# Altium footprint library Connectors.PcbLib: 245 footprints (part 13 of 16)
Each footprint in its own frame and in the unit in brackets; x right, y up, seen from the top. Pads: shape width x height; smd on the part's side, far side on the other; paste and mask are expansions set on the pad; w line width, h text height; cw(c..) or ccw(c..) is an arc to the next point about the centre after c.
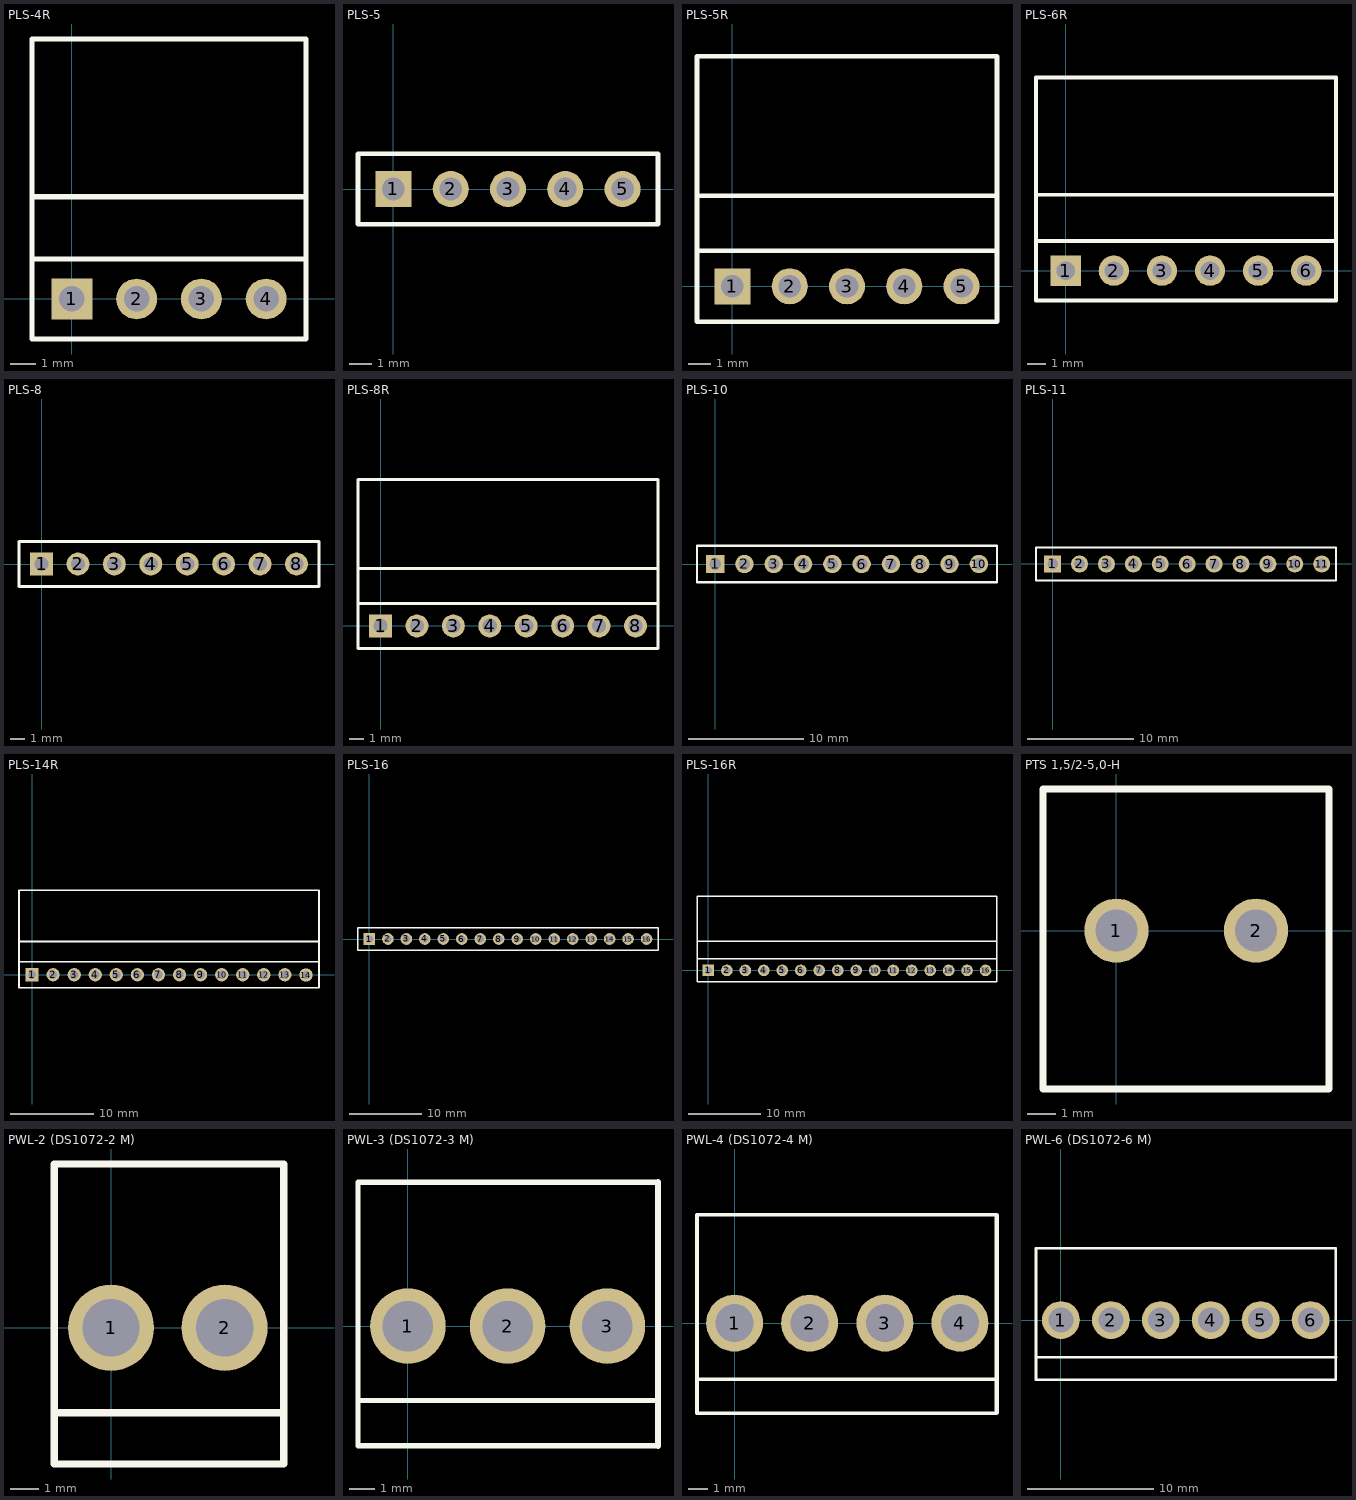
[diagram p12: the footprints below, top view; thin cyan lines are the x and y axes]

## PLS-4R [mm]
pads (4):
  rect 1.6x1.6 hole 1: 1(0,0)
  round 1.6 hole 1: 2(2.54,0) 3(5.08,0) 4(7.62,0)
Top Overlay:
  lines w0.2: -1.57,1.57 9.19,1.57 ; -1.57,4.01 9.19,4.01 ; -1.57,-1.57 -1.57,10.2 9.19,10.2 9.19,-1.57 -1.57,-1.57
3D body "PLS-R.STEP": height 2.44, standoff -3.05, extent -1.27,-0.32 3.81,9.9
3D body "PLS-R.STEP": height 2.44, standoff -3.05, extent 3.81,-0.32 8.89,9.9

## PLS-5 [mm]
pads (5):
  rect 1.6x1.6 hole 1: 1(0,0)
  round 1.6 hole 1: 2(2.54,0) 3(5.08,0) 4(7.62,0) 5(10.16,0)
Top Overlay:
  lines w0.2: -1.57,-1.57 11.73,-1.57 11.73,1.57 -1.57,1.57 -1.57,-1.57
3D body "PLS-5.stp": height 8.7, standoff -3, extent -1.27,-1.27 11.43,1.27

## PLS-5R [mm]
pads (5):
  rect 1.6x1.6 hole 1: 1(0,0)
  round 1.6 hole 1: 2(2.54,0) 3(5.08,0) 4(7.62,0) 5(10.16,0)
Top Overlay:
  lines w0.2: -1.57,1.57 11.73,1.57 ; -1.57,4.01 11.73,4.01 ; -1.57,-1.57 -1.57,10.2 11.73,10.2 11.73,-1.57 -1.57,-1.57
3D body "PLS-5R.STEP": height 2.44, standoff -3.05, extent -1.27,-0.32 11.43,9.9

## PLS-6R [mm]
pads (6):
  rect 1.6x1.6 hole 1: 1(0,0)
  round 1.6 hole 1: 2(2.54,0) 3(5.08,0) 4(7.62,0) 5(10.16,0) 6(12.7,0)
Top Overlay:
  lines w0.2: -1.57,1.57 14.27,1.57 ; -1.57,4.01 14.27,4.01 ; -1.57,-1.57 14.27,-1.57 14.27,10.2 -1.57,10.2 -1.57,-1.57
3D body "PLS-R.STEP": height 2.44, standoff -3.05, extent 3.81,-0.32 8.89,9.9
3D body "PLS-R.STEP": height 2.44, standoff -3.05, extent -1.27,-0.32 3.81,9.9
3D body "PLS-R.STEP": height 2.44, standoff -3.05, extent 8.89,-0.32 13.97,9.9

## PLS-8 [mm]
pads (8):
  rect 1.6x1.6 hole 1: 1(0,0)
  round 1.6 hole 1: 2(2.54,0) 3(5.08,0) 4(7.62,0) 5(10.16,0) 6(12.7,0) 7(15.24,0) 8(17.78,0)
Top Overlay:
  lines w0.2: -1.57,-1.57 -1.57,1.57 19.35,1.57 19.35,-1.57 -1.57,-1.57
3D body "PLS-8.stp": height 8.7, standoff -3, extent -1.27,-1.27 19.05,1.27

## PLS-8R [mm]
pads (8):
  rect 1.6x1.6 hole 1: 1(0,0)
  round 1.6 hole 1: 2(2.54,0) 3(5.08,0) 4(7.62,0) 5(10.16,0) 6(12.7,0) 7(15.24,0) 8(17.78,0)
Top Overlay:
  lines w0.2: -1.57,1.57 19.35,1.57 ; -1.57,4.01 19.35,4.01 ; -1.57,-1.57 19.35,-1.57 19.35,10.2 -1.57,10.2 -1.57,-1.57
3D body "PLS-R.STEP": height 2.44, standoff -3.05, extent 3.81,-0.32 8.89,9.9
3D body "PLS-R.STEP": height 2.44, standoff -3.05, extent -1.27,-0.32 3.81,9.9
3D body "PLS-R.STEP": height 2.44, standoff -3.05, extent 13.97,-0.32 19.05,9.9
3D body "PLS-R.STEP": height 2.44, standoff -3.05, extent 8.89,-0.32 13.97,9.9

## PLS-10 [mm]
pads (10):
  rect 1.6x1.6 hole 1: 1(0,0)
  round 1.6 hole 1: 2(2.54,0) 3(5.08,0) 4(7.62,0) 5(10.16,0) 6(12.7,0) 7(15.24,0) 8(17.78,0) 9(20.32,0) 10(22.86,0)
Top Overlay:
  lines w0.2: -1.57,-1.57 24.43,-1.57 24.43,1.57 -1.57,1.57 -1.57,-1.57
3D body "PLS-10.stp": height 8.7, standoff -3, extent -1.27,-1.27 24.13,1.27

## PLS-11 [mm]
pads (11):
  rect 1.6x1.6 hole 1: 1(0,0)
  round 1.6 hole 1: 2(2.54,0) 3(5.08,0) 4(7.62,0) 5(10.16,0) 6(12.7,0) 7(15.24,0) 8(17.78,0) 9(20.32,0) 10(22.86,0) 11(25.4,0)
Top Overlay:
  lines w0.2: -1.57,-1.57 26.75,-1.57 26.75,1.57 -1.57,1.57 -1.57,-1.57
3D body "PLS-10.stp": height 8.7, standoff -3, extent 1.25,-1.29 26.65,1.25
3D body "PLS-10.stp": height 8.7, standoff -3, extent -1.27,-1.27 24.13,1.27

## PLS-14R [mm]
pads (14):
  rect 1.6x1.6 hole 1: 1(0,0)
  round 1.6 hole 1: 2(2.54,0) 3(5.08,0) 4(7.62,0) 5(10.16,0) 6(12.7,0) 7(15.24,0) 8(17.78,0) 9(20.32,0) 10(22.86,0) 11(25.4,0) 12(27.94,0) 13(30.48,0) 14(33.02,-0.025)
Top Overlay:
  lines w0.2: -1.57,1.57 34.59,1.57 ; -1.57,4.01 34.59,4.01 ; -1.57,-1.57 34.59,-1.57 34.59,10.2 -1.57,10.2 -1.57,-1.57
3D body "PLS-R.STEP": height 2.44, standoff -3.05, extent 29.21,-0.32 34.29,9.9
3D body "PLS-R.STEP": height 2.44, standoff -3.05, extent -1.27,-0.32 3.81,9.9
3D body "PLS-5R.STEP": height 2.44, standoff -3.05, extent 3.81,-0.32 16.51,9.9
3D body "PLS-5R.STEP": height 2.44, standoff -3.05, extent 16.51,-0.32 29.21,9.9

## PLS-16 [mm]
pads (16):
  rect 1.6x1.6 hole 1: 1(0,0)
  round 1.6 hole 1: 2(2.54,0) 3(5.08,0) 4(7.62,0) 5(10.16,0) 6(12.7,0) 7(15.24,0) 8(17.78,0) 9(20.32,0) 10(22.86,0) 11(25.4,0) 12(27.94,0) 13(30.48,0) 14(33.02,0) 15(35.56,0) 16(38.1,0)
Top Overlay:
  lines w0.2: -1.57,-1.57 39.67,-1.57 39.67,1.57 -1.57,1.57 -1.57,-1.57
3D body "PLS-16.stp": height 8.7, standoff -3, extent -1.27,-1.27 39.37,1.27

## PLS-16R [mm]
pads (16):
  rect 1.6x1.6 hole 1: 1(0,0)
  round 1.6 hole 1: 2(2.54,0) 3(5.08,0) 4(7.62,0) 5(10.16,0) 6(12.7,0) 7(15.24,0) 8(17.78,0) 9(20.32,0) 10(22.86,0) 11(25.4,0) 12(27.94,0) 13(30.48,0) 14(33.02,0) 15(35.56,0) 16(38.1,0)
Top Overlay:
  lines w0.2: -1.57,1.57 39.67,1.57 ; -1.57,4.01 39.67,4.01 ; -1.57,-1.57 39.67,-1.57 39.67,10.2 -1.57,10.2 -1.57,-1.57
3D body "PLS-R.STEP": height 2.44, standoff -3.05, extent 8.89,-0.32 13.97,9.9
3D body "PLS-R.STEP": height 2.44, standoff -3.05, extent 24.13,-0.32 29.21,9.9
3D body "PLS-R.STEP": height 2.44, standoff -3.05, extent 19.05,-0.32 24.13,9.9
3D body "PLS-R.STEP": height 2.44, standoff -3.05, extent 13.97,-0.32 19.05,9.9
3D body "PLS-R.STEP": height 2.44, standoff -3.05, extent 29.21,-0.32 34.29,9.9
3D body "PLS-R.STEP": height 2.44, standoff -3.05, extent 34.29,-0.32 39.37,9.9
3D body "PLS-R.STEP": height 2.44, standoff -3.05, extent 3.81,-0.32 8.89,9.9
3D body "PLS-R.STEP": height 2.44, standoff -3.05, extent -1.27,-0.32 3.81,9.9

## PTS 1,5/2-5,0-H [mm]
height 13.6
pads (2):
  round 2.3 hole 1.5: 1(0,0) 2(5,0)
Top Overlay:
  lines w0.254: -2.63,-5.67 -2.63,5.07 7.611,5.07 7.611,0 7.611,-5.67 -2.63,-5.67
3D body "1792863.stp": height 13.72, standoff -2.38, extent -2.49,-5.56 7.51,4.94

## PWL-2 (DS1072-2 M) [mm] "PHU-8 (DS1072-8 F) ответная часть"
pads (2):
  round 3 hole 2: 1(0,0) 2(3.96,0)
Top Overlay:
  lines w0.254: -1.96,-2.96 6.02,-2.96 ; -1.98,-4.75 -1.98,5.71 6.02,5.71 6.02,-4.75 -1.98,-4.75
3D body "User Library-PWL-2.step": height 13.8, standoff -3.6, extent -2.02,-4.76 5.9,5.64

## PWL-3 (DS1072-3 M) [mm] "PHU-8 (DS1072-8 F) ответная часть"
pads (3):
  round 3 hole 2: 1(0,0) 2(3.96,0) 3(7.92,0)
Top Overlay:
  lines w0.2: -1.96,-2.96 9.93,-2.96 ; 9.93,-4.75 -1.98,-4.75 -1.98,5.71 9.93,5.71
  lines w0.254: 9.93,-4.75 9.93,2.813 9.93,5.71
3D body "User Library-PWL-3.step": height 13.8, standoff -3.6, extent -1.98,-4.69 9.9,5.71

## PWL-4 (DS1072-4 M) [mm] "PHU-8 (DS1072-8 F) ответная часть"
pads (4):
  round 3 hole 2: 1(0,0) 2(3.96,0) 3(7.92,0) 4(11.88,0)
Top Overlay:
  lines w0.2: -1.96,-2.96 13.832,-2.96 ; 13.823,-4.75 -1.98,-4.75 -1.98,5.71 13.823,5.71
  lines w0.254: 13.823,-4.716 13.823,0 13.823,5.684
3D body "User Library-PWL-4.step": height 13.8, standoff -3.6, extent -1.98,-4.75 13.86,5.65

## PWL-6 (DS1072-6 M) [mm] "PHU-8 (DS1072-8 F) ответная часть"
pads (6):
  round 3 hole 2: 1(0,0) 2(3.96,0) 3(7.92,0) 4(11.88,0) 5(15.84,0) 6(19.8,0)
Top Overlay:
  lines w0.2: -1.96,-2.96 21.82,-2.96 ; -1.98,-4.75 -1.98,5.71 21.8,5.71 21.8,-4.75 -1.98,-4.75
3D body "User Library-PWL-4.step": height 13.8, standoff -3.6, extent -1.98,-4.75 13.86,5.65
3D body "User Library-PWL-4.step": height 13.8, standoff -3.6, extent 5.94,-4.75 21.78,5.65